# Altium footprint library DIP254P.PcbLib: 14 footprints
Each footprint in its own frame and in the unit in brackets; x right, y up, seen from the top. Pads: shape width x height; smd on the part's side, far side on the other; paste and mask are expansions set on the pad; w line width, h text height; cw(c..) or ccw(c..) is an arc to the next point about the centre after c.
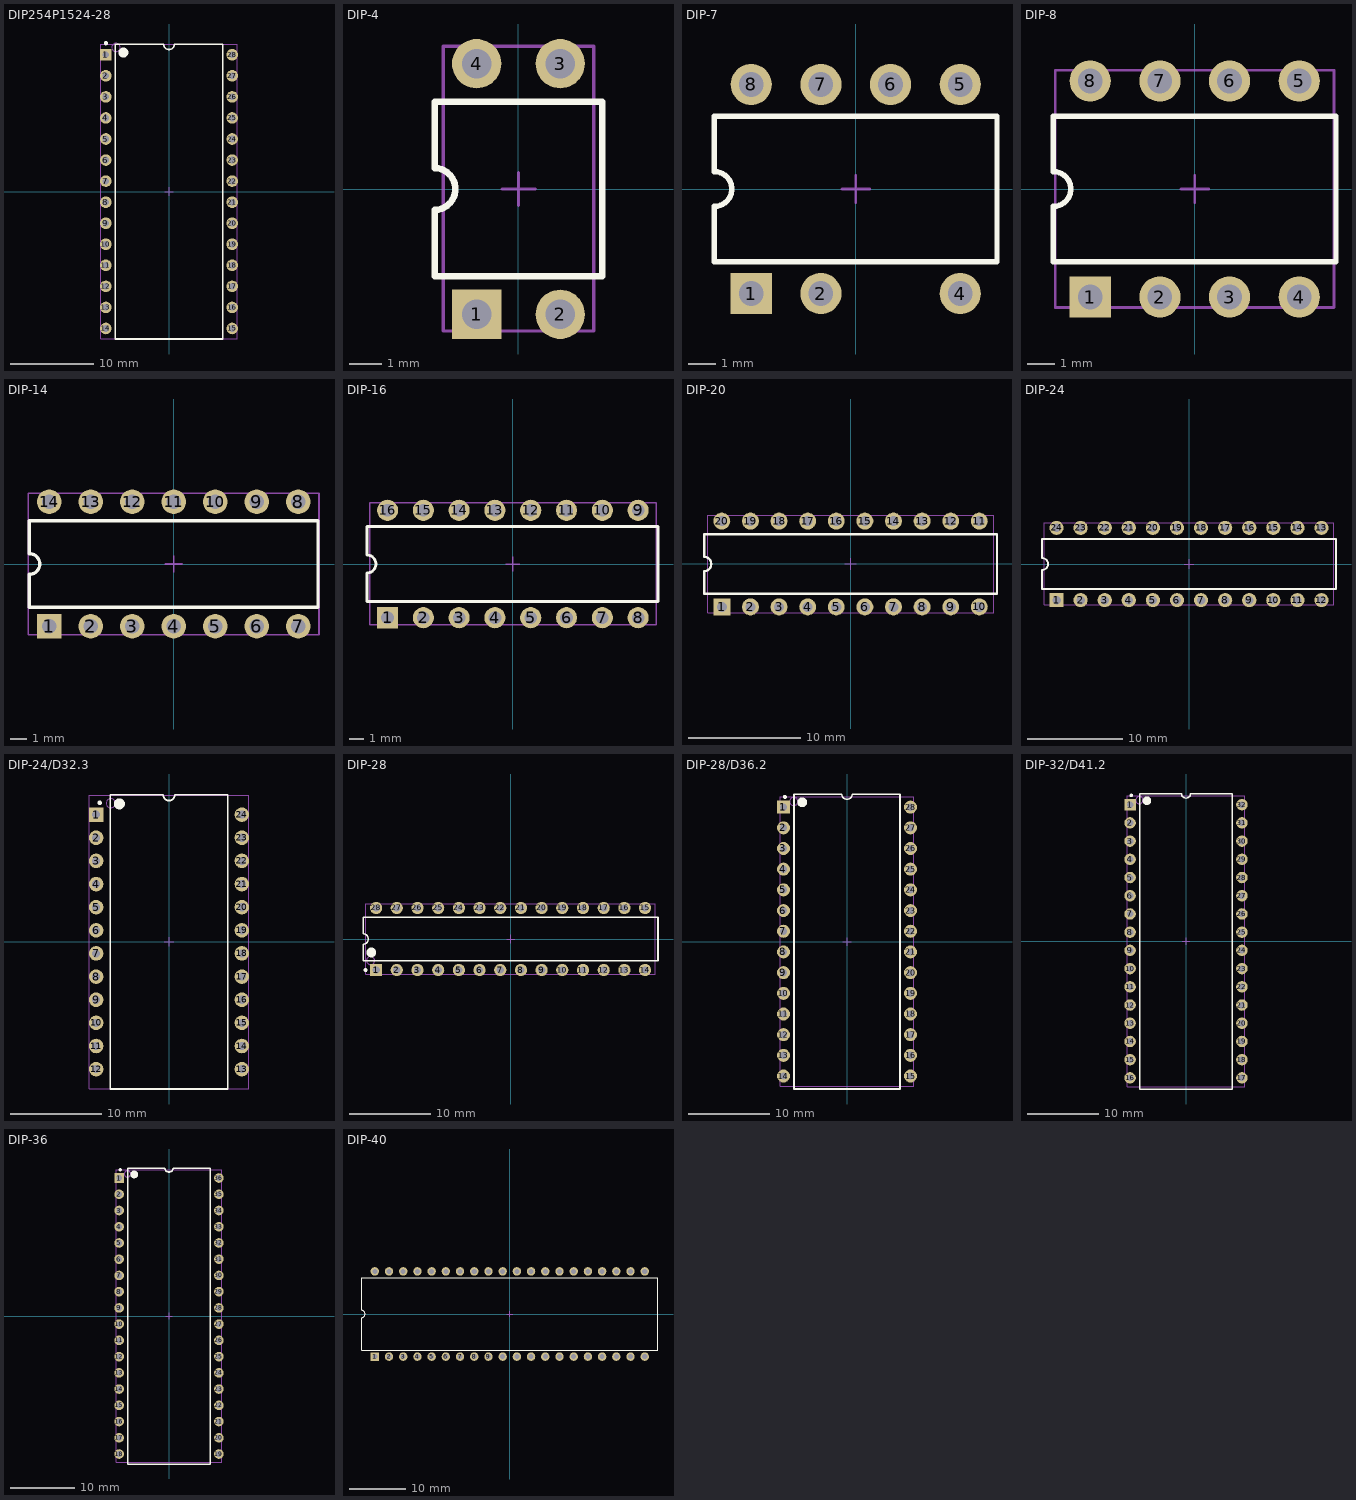
[diagram p0: the footprints below, top view; thin cyan lines are the x and y axes]

## DIP254P1524-28 [mm] "DIP, 28-Pin, Row Spacing 15.24 mm, Pitch 2.54 mm"
height 5.7
pads (28):
  rect 1.4x1.4 hole 0.8: 1(-7.62,16.51)
  round 1.4 hole 0.8: 2(-7.62,13.97) 3(-7.62,11.43) 4(-7.62,8.89) 5(-7.62,6.35) 6(-7.62,3.81) 7(-7.62,1.27) 8(-7.62,-1.27) 9(-7.62,-3.81) 10(-7.62,-6.35) 11(-7.62,-8.89) 12(-7.62,-11.43) 13(-7.62,-13.97) 14(-7.62,-16.51) 15(7.62,-16.51) 16(7.62,-13.97) 17(7.62,-11.43) 18(7.62,-8.89) 19(7.62,-6.35) 20(7.62,-3.81) 21(7.62,-1.27) 22(7.62,1.27) 23(7.62,3.81) 24(7.62,6.35) 25(7.62,8.89) 26(7.62,11.43) 27(7.62,13.97) 28(7.62,16.51)
Top Overlay:
  circle w0.6: c-5.5,16.78 r0.3
  circle w0.25: c-7.62,17.907 r0.125
  lines w0.2: -6.5,-17.78 6.5,-17.78 6.5,17.78 0.635,17.78 cw(c0,17.78) -0.635,17.78 -6.5,17.78 -6.5,-17.78
Mechanical 13:
  circle w0.1: c-6.4,17.4 r0.5
  lines w0.1: -8.225,-17.78 8.225,-17.78 8.225,17.78 -8.225,17.78 -8.225,-17.78
Mechanical 15:
  lines w0.1: -0.5,0 0.5,0 ; 0,-0.5 0,0.5
3D body: height 5.22, standoff -3.19, extent -8.225,-17.78 8.225,17.78

## DIP-4 [mm] "DIP; 4 Leads; Row Spacing 7.62 mm; Pitch 2.54 mm"
height 4.57
pads (4):
  rect 1.5x1.5 hole 0.9: 1(-1.27,-3.81)
  round 1.5 hole 0.9: 2(1.27,-3.81) 3(1.27,3.81) 4(-1.27,3.81)
Top Overlay:
  lines w0.2: -2.55,-2.65 -2.55,-0.635 ccw(c-2.55,0) -2.55,0.635 -2.55,2.65 2.55,2.65 2.55,-2.65 -2.55,-2.65
Mechanical 13:
  lines w0.1: -2.286,-4.318 -2.286,4.343 -2.184,4.343 2.286,4.343 2.286,-4.318 2.261,-4.318 2.134,-4.318 1.829,-4.318 0.584,-4.318 -2.286,-4.318
Mechanical 15:
  lines w0.1: -0.5,0 0,0 ; 0,-0.5 0,0 ; 0,0.5 0,0 ; 0.508,0 0,0
3D body: height 4.21, standoff -3.26, extent -2.286,-4.318 2.294,4.332

## DIP-7 [mm] "DIP; 8 Leads; Row Spacing 7.62 mm; Pitch 2.54 mm"
height 5.33
pads (7):
  rect 1.5x1.5 hole 0.9: 1(-3.81,-3.81)
  round 1.5 hole 0.9: 2(-1.27,-3.81) 4(3.81,-3.81) 5(3.81,3.81) 6(1.27,3.81) 7(-1.27,3.81) 8(-3.81,3.81)
Top Overlay:
  lines w0.2: -5.15,-2.65 -5.15,-0.635 ccw(c-5.15,0) -5.15,0.635 -5.15,2.65 5.15,2.65 5.15,-2.65 -5.15,-2.65
Mechanical 15:
  lines w0.1: -0.5,0 0,0 ; 0,-0.5 0,0 ; 0,0.5 0,0 ; 0.508,0 0,0
3D body: height 4.51, standoff -2.96, extent -5.08,-4.318 5.08,4.332

## DIP-8 [mm] "DIP; 8 Leads; Row Spacing 7.62 mm; Pitch 2.54 mm"
height 5.33
pads (8):
  rect 1.5x1.5 hole 0.9: 1(-3.81,-3.94)
  round 1.5 hole 0.9: 2(-1.27,-3.94) 3(1.27,-3.94) 4(3.81,-3.94) 5(3.81,3.94) 6(1.27,3.94) 7(-1.27,3.94) 8(-3.81,3.94)
Top Overlay:
  lines w0.2: -5.15,-2.65 -5.15,-0.635 ccw(c-5.15,0) -5.15,0.635 -5.15,2.65 5.15,2.65 5.15,-2.65 -5.15,-2.65
Mechanical 13:
  lines w0.1: -5.08,-4.318 5.08,-4.318 5.08,4.332 -5.08,4.332 -5.08,-4.318
Mechanical 15:
  lines w0.1: -0.5,0 0,0 ; 0,-0.5 0,0 ; 0,0.5 0,0 ; 0.508,0 0,0
3D body: height 4.41, standoff -3.06, extent -5.08,-4.318 5.08,4.332

## DIP-14 [mm] "DIP; 14 Leads; Row Spacing 7.62 mm; Pitch 2.54 mm"
height 5.08
pads (14):
  rect 1.5x1.5 hole 0.9: 1(-7.62,-3.81)
  round 1.5 hole 0.9: 2(-5.08,-3.81) 3(-2.54,-3.81) 4(0,-3.81) 5(2.54,-3.81) 6(5.08,-3.81) 7(7.62,-3.81) 8(7.62,3.81) 9(5.08,3.81) 10(2.54,3.81) 11(0,3.81) 12(-2.54,3.81) 13(-5.08,3.81) 14(-7.62,3.81)
Top Overlay:
  lines w0.2: -8.83,-2.65 -8.83,-0.635 ccw(c-8.83,0) -8.83,0.635 -8.83,2.65 8.83,2.65 8.83,-2.65 -8.83,-2.65
Mechanical 13:
  lines w0.1: -8.89,-4.318 -8.89,4.332 8.89,4.332 8.89,-4.318 -8.89,-4.318
Mechanical 15:
  lines w0.1: -0.5,0 0,0 ; 0,-0.5 0,0 ; 0,0.5 0,0 ; 0.508,0 0,0
3D body: height 4.41, standoff -3.06, extent -8.89,-4.318 8.89,4.332

## DIP-16 [mm] "DIP; 16 Leads; Row Spacing 7.62 mm; Pitch 2.54 mm"
height 5.08
pads (16):
  rect 1.5x1.5 hole 0.9: 1(-8.89,-3.81)
  round 1.5 hole 0.9: 2(-6.35,-3.81) 3(-3.81,-3.81) 4(-1.27,-3.81) 5(1.27,-3.81) 6(3.81,-3.81) 7(6.35,-3.81) 8(8.89,-3.81) 9(8.89,3.81) 10(6.35,3.81) 11(3.81,3.81) 12(1.27,3.81) 13(-1.27,3.81) 14(-3.81,3.81) 15(-6.35,3.81) 16(-8.89,3.81)
Top Overlay:
  lines w0.2: -10.351,-2.65 -10.351,-0.635 ccw(c-10.351,0) -10.351,0.635 -10.351,2.65 ; -10.3,-2.65 10.3,-2.65 10.3,2.65 -10.3,2.65
Mechanical 13:
  lines w0.1: -10.16,-4.318 -10.16,4.332 10.16,4.332 10.16,-4.318 -10.16,-4.318
Mechanical 15:
  lines w0.1: -0.5,0 0,0 ; 0,-0.5 0,0 ; 0,0.5 0,0 ; 0.508,0 0,0
3D body: height 4.41, standoff -3.06, extent -10.16,-4.318 10.16,4.332

## DIP-20 [mm] "DIP; 20 Leads; Row Spacing 7.62 mm; Pitch 2.54 mm"
height 5.08
pads (20):
  rect 1.5x1.5 hole 0.9: 1(-11.43,-3.81)
  round 1.5 hole 0.9: 2(-8.89,-3.81) 3(-6.35,-3.81) 4(-3.81,-3.81) 5(-1.27,-3.81) 6(1.27,-3.81) 7(3.81,-3.81) 8(6.35,-3.81) 9(8.89,-3.81) 10(11.43,-3.81) 11(11.43,3.81) 12(8.89,3.81) 13(6.35,3.81) 14(3.81,3.81) 15(1.27,3.81) 16(-1.27,3.81) 17(-3.81,3.81) 18(-6.35,3.81) 19(-8.89,3.81) 20(-11.43,3.81)
Top Overlay:
  lines w0.2: -13,-2.65 13,-2.65 13,2.65 -13,2.65 -13,0.635 cw(c-13,0) -13,-0.635 -13,-2.65
Mechanical 13:
  lines w0.1: -12.7,-4.318 -12.7,4.332 12.7,4.332 12.7,-4.318 -12.7,-4.318
Mechanical 15:
  lines w0.1: -0.5,0 0,0 ; 0,-0.5 0,0 ; 0,0.5 0,0 ; 0.508,0 0,0
3D body: height 4.41, standoff -3.06, extent -12.7,-4.318 12.7,4.332

## DIP-24 [mm] "DIP; 24 Leads; Row Spacing 7.62 mm; Pitch 2.54 mm"
height 5.33
pads (24):
  rect 1.5x1.5 hole 0.9: 1(-13.97,-3.81)
  round 1.5 hole 0.9: 2(-11.43,-3.81) 3(-8.89,-3.81) 4(-6.35,-3.81) 5(-3.81,-3.81) 6(-1.27,-3.81) 7(1.27,-3.81) 8(3.81,-3.81) 9(6.35,-3.81) 10(8.89,-3.81) 11(11.43,-3.81) 12(13.97,-3.81) 13(13.97,3.81) 14(11.43,3.81) 15(8.89,3.81) 16(6.35,3.81) 17(3.81,3.81) 18(1.27,3.81) 19(-1.27,3.81) 20(-3.81,3.81) 21(-6.35,3.81) 22(-8.89,3.81) 23(-11.43,3.81) 24(-13.97,3.81)
Top Overlay:
  lines w0.2: -15.5,-2.65 15.5,-2.65 15.5,2.65 -15.5,2.65 -15.5,0.635 cw(c-15.5,0) -15.5,-0.635 -15.5,-2.65
Mechanical 13:
  lines w0.05: -15.24,-4.318 15.24,-4.318 15.24,4.332 -15.24,4.332 -15.24,-4.318
Mechanical 15:
  lines w0.1: -0.5,0 0,0 ; 0,-0.5 0,0 ; 0,0.5 0,0 ; 0.508,0 0,0
3D body: height 4.41, standoff -3.06, extent -15.24,-4.318 15.24,4.332

## DIP-24/D32.3 [mm] "DIP, 24-Pin, Row Spacing 15.24 mm, Pitch 2.54 mm"
height 4.98
pads (24):
  rect 1.6x1.6 hole 0.9: 1(-8,13.97)
  round 1.6 hole 0.9: 2(-8,11.43) 3(-8,8.89) 4(-8,6.35) 5(-8,3.81) 6(-8,1.27) 7(-8,-1.27) 8(-8,-3.81) 9(-8,-6.35) 10(-8,-8.89) 11(-8,-11.43) 12(-8,-13.97) 13(8,-13.97) 14(8,-11.43) 15(8,-8.89) 16(8,-6.35) 17(8,-3.81) 18(8,-1.27) 19(8,1.27) 20(8,3.81) 21(8,6.35) 22(8,8.89) 23(8,11.43) 24(8,13.97)
Top Overlay:
  circle w0.6: c-5.45,15.15 r0.3
  circle w0.25: c-7.62,15.27 r0.125
  lines w0.2: -6.45,-16.15 6.45,-16.15 6.45,16.15 0.635,16.15 cw(c0,16.15) -0.635,16.15 -6.45,16.15 -6.45,-16.15
Mechanical 13:
  circle w0.1: c-6.4,15.225 r0.5
  lines w0.1: -8.763,-16.125 8.763,-16.125 8.763,16.125 -8.763,16.125 -8.763,-16.125
Mechanical 15:
  lines w0.1: -0.5,0 0.5,0 ; 0,-0.5 0,0.5
3D body: height 5.02, standoff -3.4, extent -8.763,-16.125 8.763,16.125

## DIP-28 [mm] "DIP, 28-Pin, Row Spacing 7.62 mm, Pitch 2.54 mm"
height 5.33
pads (28):
  rect 1.5x1.5 hole 0.9: 1(-16.51,-3.81)
  round 1.5 hole 0.9: 2(-13.97,-3.81) 3(-11.43,-3.81) 4(-8.89,-3.81) 5(-6.35,-3.81) 6(-3.81,-3.81) 7(-1.27,-3.81) 8(1.27,-3.81) 9(3.81,-3.81) 10(6.35,-3.81) 11(8.89,-3.81) 12(11.43,-3.81) 13(13.97,-3.81) 14(16.51,-3.81) 15(16.51,3.81) 16(13.97,3.81) 17(11.43,3.81) 18(8.89,3.81) 19(6.35,3.81) 20(3.81,3.81) 21(1.27,3.81) 22(-1.27,3.81) 23(-3.81,3.81) 24(-6.35,3.81) 25(-8.89,3.81) 26(-11.43,3.81) 27(-13.97,3.81) 28(-16.51,3.81)
Top Overlay:
  circle w0.25: c-17.81,-3.81 r0.125
  circle w0.6: c-17.1,-1.65 r0.3
  lines w0.2: -18.1,-2.65 18.1,-2.65 18.1,2.65 -18.1,2.65 -18.1,0.635 cw(c-18.1,0) -18.1,-0.635 -18.1,-2.65
Mechanical 13:
  circle w0.1: c-17.2,-2.65 r0.5
  lines w0.1: -17.78,-4.318 17.78,-4.318 17.78,4.332 -17.78,4.332 -17.78,-4.318
Mechanical 15:
  lines w0.1: -0.5,0 0.5,0 ; 0,-0.5 0,0.5
3D body: height 4.41, standoff -3.06, extent -17.78,-4.318 17.78,4.332

## DIP-28/D36.2 [mm] "DIP, 28-Pin, Row Spacing 15.24 mm, Pitch 2.54 mm"
height 4.5
pads (28):
  rect 1.6x1.6 hole 0.9: 1(-7.8,16.51)
  round 1.6 hole 0.9: 2(-7.8,13.97) 3(-7.8,11.43) 4(-7.8,8.89) 5(-7.8,6.35) 6(-7.8,3.81) 7(-7.8,1.27) 8(-7.8,-1.27) 9(-7.8,-3.81) 10(-7.8,-6.35) 11(-7.8,-8.89) 12(-7.8,-11.43) 13(-7.8,-13.97) 14(-7.8,-16.51) 15(7.8,-16.51) 16(7.8,-13.97) 17(7.8,-11.43) 18(7.8,-8.89) 19(7.8,-6.35) 20(7.8,-3.81) 21(7.8,-1.27) 22(7.8,1.27) 23(7.8,3.81) 24(7.8,6.35) 25(7.8,8.89) 26(7.8,11.43) 27(7.8,13.97) 28(7.8,16.51)
Top Overlay:
  circle w0.25: c-7.62,17.76 r0.125
  circle w0.6: c-5.5,17.1 r0.3
  lines w0.2: -6.5,-18.1 -6.5,18.1 -0.635,18.1 ccw(c0,18.1) 0.635,18.1 6.5,18.1 6.5,-18.1 -6.5,-18.1
Mechanical 13:
  circle w0.1: c-6.525,17.2 r0.5
  lines w0.1: -8.225,-17.78 -8.225,17.78 8.225,17.78 8.225,-17.78 -8.225,-17.78
Mechanical 15:
  lines w0.1: -0.5,0 0.5,0 ; 0,-0.5 0,0.5
3D body: height 5.22, standoff -3.19, extent -8.225,-17.78 8.225,17.78

## DIP-32/D41.2 [mm] "DIP, Ceramic, 32-Pin, Row Spacing 15.24 mm, Pitch 2.54 mm"
height 5.08
pads (32):
  rect 1.6x1.6 hole 0.9: 1(-7.8,19.05)
  round 1.6 hole 0.9: 2(-7.8,16.51) 3(-7.8,13.97) 4(-7.8,11.43) 5(-7.8,8.89) 6(-7.8,6.35) 7(-7.8,3.81) 8(-7.8,1.27) 9(-7.8,-1.27) 10(-7.8,-3.81) 11(-7.8,-6.35) 12(-7.8,-8.89) 13(-7.8,-11.43) 14(-7.8,-13.97) 15(-7.8,-16.51) 16(-7.8,-19.05) 17(7.8,-19.05) 18(7.8,-16.51) 19(7.8,-13.97) 20(7.8,-11.43) 21(7.8,-8.89) 22(7.8,-6.35) 23(7.8,-3.81) 24(7.8,-1.27) 25(7.8,1.27) 26(7.8,3.81) 27(7.8,6.35) 28(7.8,8.89) 29(7.8,11.43) 30(7.8,13.97) 31(7.8,16.51) 32(7.8,19.05)
Top Overlay:
  circle w0.25: c-7.62,20.35 r0.125
  circle w0.6: c-5.45,19.6 r0.3
  lines w0.2: -6.45,-20.6 -6.45,20.6 -0.635,20.6 ccw(c0,20.6) 0.635,20.6 6.45,20.6 6.45,-20.6 -6.45,-20.6
Mechanical 13:
  circle w0.1: c-6.5,19.675 r0.5
  lines w0.1: -8.225,-20.32 -8.225,20.32 8.225,20.32 8.225,-20.32 -8.225,-20.32
Mechanical 15:
  lines w0.1: -0.5,0 0.5,0 ; 0,-0.5 0,0.5
3D body: height 5.22, standoff -3.19, extent -8.225,-20.32 8.225,20.32

## DIP-36 [mm] "DIP, Ceramic, 36-Pin, Row Spacing 15.24 mm, Pitch 2.54 mm"
height 5.08
pads (36):
  rect 1.5x1.5 hole 0.9: 1(-7.8,21.59)
  round 1.5 hole 0.9: 2(-7.8,19.05) 3(-7.8,16.51) 4(-7.8,13.97) 5(-7.8,11.43) 6(-7.8,8.89) 7(-7.8,6.35) 8(-7.8,3.81) 9(-7.8,1.27) 10(-7.8,-1.27) 11(-7.8,-3.81) 12(-7.8,-6.35) 13(-7.8,-8.89) 14(-7.8,-11.43) 15(-7.8,-13.97) 16(-7.8,-16.51) 17(-7.8,-19.05) 18(-7.8,-21.59) 19(7.8,-21.59) 20(7.8,-19.05) 21(7.8,-16.51) 22(7.8,-13.97) 23(7.8,-11.43) 24(7.8,-8.89) 25(7.8,-6.35) 26(7.8,-3.81) 27(7.8,-1.27) 28(7.8,1.27) 29(7.8,3.81) 30(7.8,6.35) 31(7.8,8.89) 32(7.8,11.43) 33(7.8,13.97) 34(7.8,16.51) 35(7.8,19.05) 36(7.8,21.59)
Top Overlay:
  circle w0.25: c-7.62,22.89 r0.125
  circle w0.6: c-5.45,22.15 r0.3
  lines w0.2: -6.45,-23.15 -6.45,23.15 -0.635,23.15 ccw(c0,23.15) 0.635,23.15 6.45,23.15 6.45,-23.15 -6.45,-23.15
Mechanical 13:
  circle w0.1: c-6.5,22.225 r0.5
  lines w0.1: -8.225,-22.86 -8.225,22.86 8.225,22.86 8.225,-22.86 -8.225,-22.86
Mechanical 15:
  lines w0.1: -0.5,0 0.5,0 ; 0,-0.5 0,0.5
3D body: height 5.22, standoff -3.19, extent -8.225,-22.86 8.225,22.86

## DIP-40 [mm] "DIP; 40 Leads; Row Spacing 15.24 mm; Pitch 2.54 mm"
height 4.92
pads (40):
  rect 1.5x1.5 hole 0.9: 1(-24.13,-7.62)
  round 1.5 hole 0.9: 2(-21.59,-7.62) 3(-19.05,-7.62) 4(-16.51,-7.62) 5(-13.97,-7.62) 6(-11.43,-7.62) 7(-8.89,-7.62) 8(-6.35,-7.62) 9(-3.81,-7.62) 10(-1.27,-7.62) 11(1.27,-7.62) 12(3.81,-7.62) 13(6.35,-7.62) 14(8.89,-7.62) 15(11.43,-7.62) 16(13.97,-7.62) 17(16.51,-7.62) 18(19.05,-7.62) 19(21.59,-7.62) 20(24.13,-7.62) 21(24.13,7.62) 22(21.59,7.62) 23(19.05,7.62) 24(16.51,7.62) 25(13.97,7.62) 26(11.43,7.62) 27(8.89,7.62) 28(6.35,7.62) 29(3.81,7.62) 30(1.27,7.62) 31(-1.27,7.62) 32(-3.81,7.62) 33(-6.35,7.62) 34(-8.89,7.62) 35(-11.43,7.62) 36(-13.97,7.62) 37(-16.51,7.62) 38(-19.05,7.62) 39(-21.59,7.62) 40(-24.13,7.62)
Top Overlay:
  lines w0.2: -26.5,-6.45 26.5,-6.45 26.5,6.45 -26.5,6.45 -26.5,0.635 cw(c-26.5,0) -26.5,-0.635 -26.5,-6.45
Mechanical 15:
  lines w0.1: -0.5,0 0,0 ; 0,-0.5 0,0 ; 0,0.5 0,0 ; 0.508,0 0,0
3D body: height 5.22, standoff -3.19, extent -26.162,-8.23 26.162,8.22